# Altium footprint library con-molex.PCBLIB: 369 footprints (part 6 of 26)
Each footprint in its own frame and in the unit in brackets; x right, y up, seen from the top. Pads: shape width x height; smd on the part's side, far side on the other; paste and mask are expansions set on the pad; w line width, h text height; cw(c..) or ccw(c..) is an arc to the next point about the centre after c.
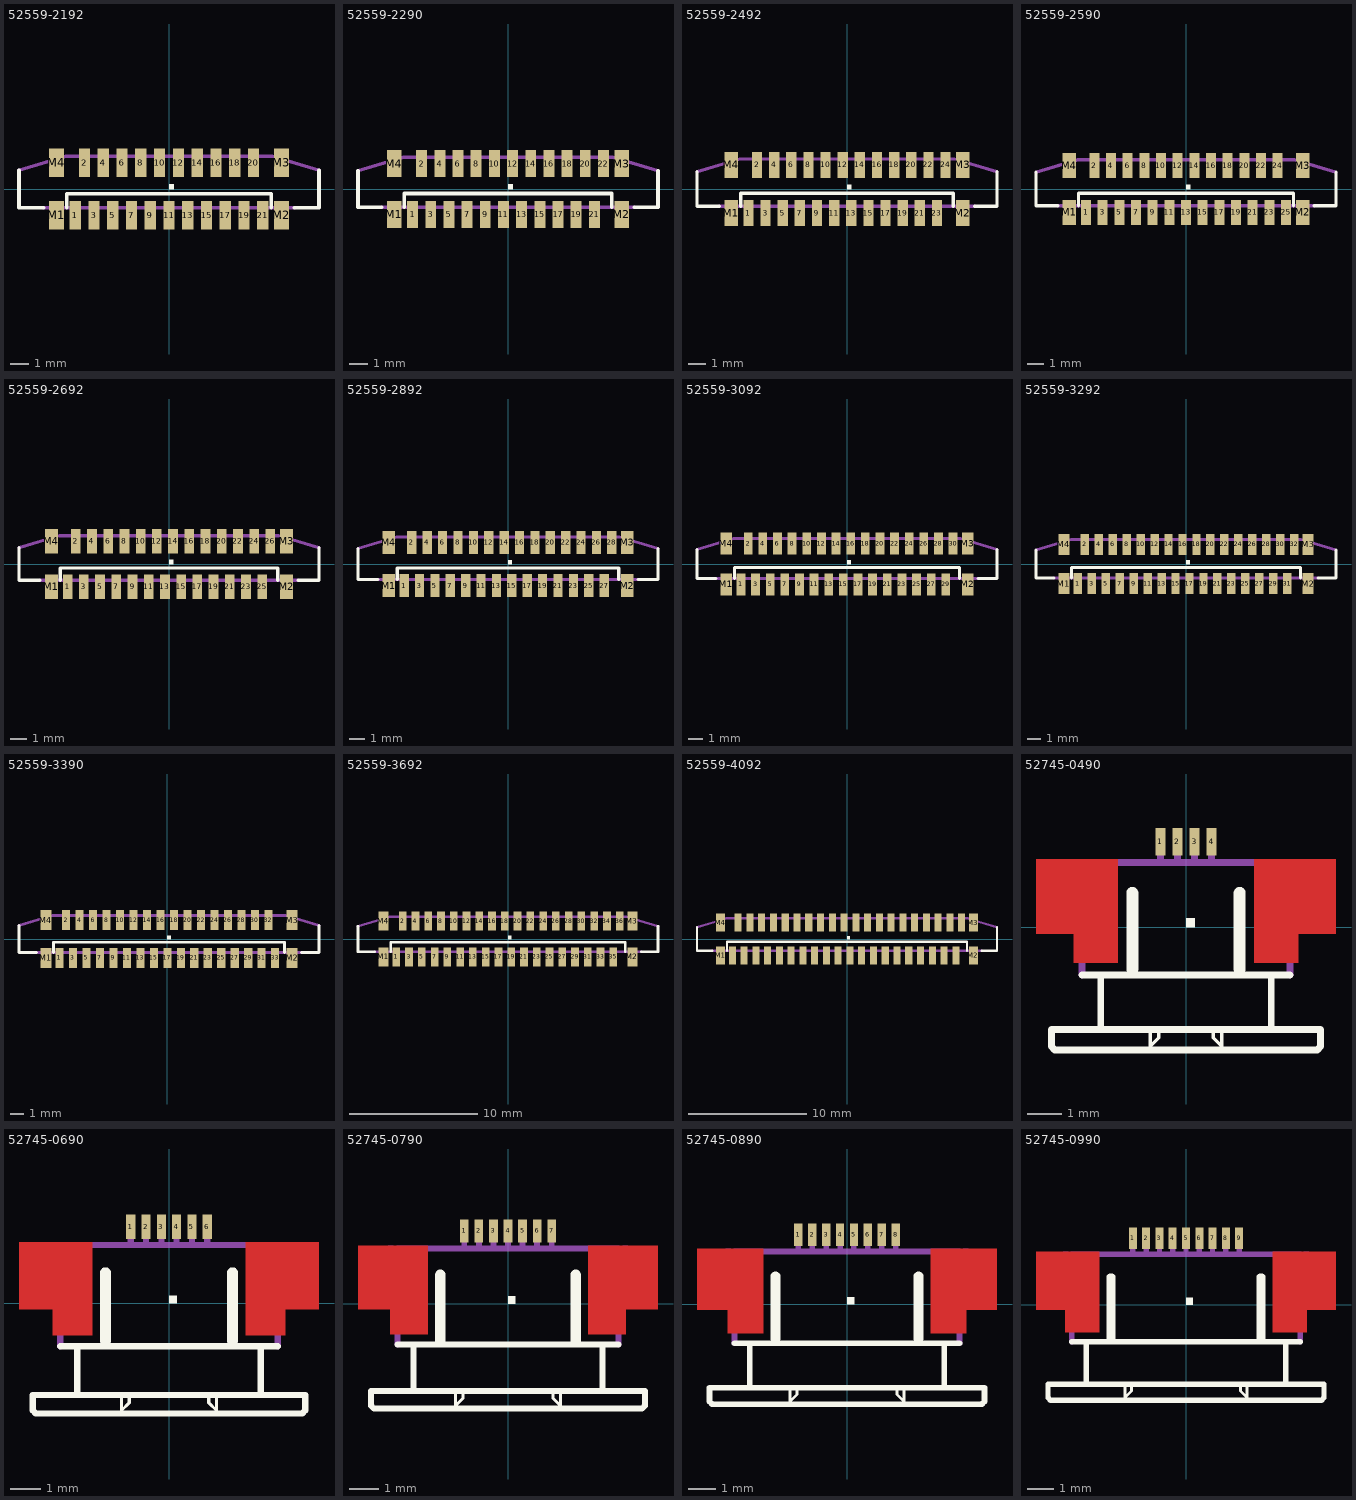
[diagram p5: the footprints below, top view; thin cyan lines are the x and y axes]

## 52559-2192 [mm]
pads (25):
  rect 0.6x1.5 smd: 1(-5,-1.4) 2(-4.5,1.4) 3(-4,-1.4) 4(-3.5,1.4) 5(-3,-1.4) 6(-2.5,1.4) 7(-2,-1.4) 8(-1.5,1.4) 9(-1,-1.4) 10(-0.5,1.4) 11(0,-1.4) 12(0.5,1.4) 13(1,-1.4) 14(1.5,1.4) 15(2,-1.4) 16(2.5,1.4) 17(3,-1.4) 18(3.5,1.4) 19(4,-1.4) 20(4.5,1.4) 21(5,-1.4)
  rect 0.8x1.5 smd: M1(-6,-1.4) M2(6,-1.4) M3(6,1.4) M4(-6,1.4)
Top Overlay:
  region: 0,0 0.254,0 0.254,0.254 0,0.254
  lines w0.203: -8,1 -8,-1 -6.7,-1 ; -5.45,-1 -5.45,-0.25 5.45,-0.25 5.45,-1 ; 6.7,-1 8,-1 8,1
Mechanical 16:
  rectangle: -6.25,-1.55 -5.75,-1.1
  rectangle: -5.15,-1.55 -4.85,-1.1
  rectangle: -4.15,-1.55 -3.85,-1.1
  rectangle: -3.15,-1.55 -2.85,-1.1
  rectangle: 5.75,-1.55 6.25,-1.1
  rectangle: -2.15,-1.55 -1.85,-1.1
  rectangle: -1.15,-1.55 -0.85,-1.1
  rectangle: -0.15,-1.55 0.15,-1.1
  rectangle: 0.85,-1.55 1.15,-1.1
  rectangle: 1.85,-1.55 2.15,-1.1
  rectangle: 2.85,-1.55 3.15,-1.1
  rectangle: 3.85,-1.55 4.15,-1.1
  rectangle: 4.85,-1.55 5.15,-1.1
  lines w0.203: -8,1 -5.5,1.75 5.5,1.75 8,1 ; -6.7,-1 6.7,-1

## 52559-2290 [mil]
pads (26):
  rect 23.62x59.06 smd: 1(-206.69,-55.12) 2(-187.01,55.12) 3(-167.32,-55.12) 4(-147.64,55.12) 5(-127.95,-55.12) 6(-108.27,55.12) 7(-88.58,-55.12) 8(-68.9,55.12) 9(-49.21,-55.12) 10(-29.53,55.12) 11(-9.84,-55.12) 12(9.84,55.12) 13(29.53,-55.12) 14(49.21,55.12) 15(68.9,-55.12) 16(88.58,55.12) 17(108.27,-55.12) 18(127.95,55.12) 19(147.64,-55.12) 20(167.32,55.12) 21(187.01,-55.12) 22(206.69,55.12)
  rect 31.5x59.06 smd: M1(-246.06,-55.12) M2(246.06,-55.12) M3(246.06,55.12) M4(-246.06,55.12)
Top Overlay:
  region: 0,0 10,0 10,10 0,10
  lines w8: -324.8,39.37 -324.8,-39.37 -273.62,-39.37 ; -224.41,-39.37 -224.41,-9.84 224.41,-9.84 224.41,-39.37 ; 273.62,-39.37 324.8,-39.37 324.8,39.37
Mechanical 16:
  rectangle: -255.91,-61.02 -236.22,-43.31
  rectangle: -212.6,-61.02 -200.79,-43.31
  rectangle: -173.23,-61.02 -161.42,-43.31
  rectangle: -133.86,-61.02 -122.05,-43.31
  rectangle: 236.22,-61.02 255.91,-43.31
  rectangle: -94.49,-61.02 -82.68,-43.31
  rectangle: -55.12,-61.02 -43.31,-43.31
  rectangle: -15.75,-61.02 -3.94,-43.31
  rectangle: 23.62,-61.02 35.43,-43.31
  rectangle: 62.99,-61.02 74.8,-43.31
  rectangle: 102.36,-61.02 114.17,-43.31
  rectangle: 141.73,-61.02 153.54,-43.31
  rectangle: 181.1,-61.02 192.91,-43.31
  lines w8: -324.8,39.37 -226.38,68.9 226.38,68.9 324.8,39.37 ; -273.62,-39.37 273.62,-39.37

## 52559-2492 [mil]
pads (28):
  rect 23.62x59.06 smd: 1(-226.38,-55.12) 2(-206.69,55.12) 3(-187.01,-55.12) 4(-167.32,55.12) 5(-147.64,-55.12) 6(-127.95,55.12) 7(-108.27,-55.12) 8(-88.58,55.12) 9(-68.9,-55.12) 10(-49.21,55.12) 11(-29.53,-55.12) 12(-9.84,55.12) 13(9.84,-55.12) 14(29.53,55.12) 15(49.21,-55.12) 16(68.9,55.12) 17(88.58,-55.12) 18(108.27,55.12) 19(127.95,-55.12) 20(147.64,55.12) 21(167.32,-55.12) 22(187.01,55.12) 23(206.69,-55.12) 24(226.38,55.12)
  rect 31.5x59.06 smd: M1(-265.75,-55.12) M2(265.75,-55.12) M3(265.75,55.12) M4(-265.75,55.12)
Top Overlay:
  region: 0,0 10,0 10,10 0,10
  lines w8: -344.49,39.37 -344.49,-39.37 -293.31,-39.37 ; -244.09,-39.37 -244.09,-9.84 244.09,-9.84 244.09,-39.37 ; 293.31,-39.37 344.49,-39.37 344.49,39.37
Mechanical 16:
  rectangle: -275.59,-61.02 -255.91,-43.31
  rectangle: -232.28,-61.02 -220.47,-43.31
  rectangle: -192.91,-61.02 -181.1,-43.31
  rectangle: -153.54,-61.02 -141.73,-43.31
  rectangle: 255.91,-61.02 275.59,-43.31
  rectangle: -114.17,-61.02 -102.36,-43.31
  rectangle: -74.8,-61.02 -62.99,-43.31
  rectangle: -35.43,-61.02 -23.62,-43.31
  rectangle: 3.94,-61.02 15.75,-43.31
  rectangle: 43.31,-61.02 55.12,-43.31
  rectangle: 82.68,-61.02 94.49,-43.31
  rectangle: 122.05,-61.02 133.86,-43.31
  rectangle: 161.42,-61.02 173.23,-43.31
  rectangle: 200.79,-61.02 212.6,-43.31
  lines w8: -344.49,39.37 -246.06,68.9 246.06,68.9 344.49,39.37 ; -293.31,-39.37 293.31,-39.37

## 52559-2590 [mm]
pads (29):
  rect 0.6x1.5 smd: 1(-6,-1.4) 2(-5.5,1.4) 3(-5,-1.4) 4(-4.5,1.4) 5(-4,-1.4) 6(-3.5,1.4) 7(-3,-1.4) 8(-2.5,1.4) 9(-2,-1.4) 10(-1.5,1.4) 11(-1,-1.4) 12(-0.5,1.4) 13(0,-1.4) 14(0.5,1.4) 15(1,-1.4) 16(1.5,1.4) 17(2,-1.4) 18(2.5,1.4) 19(3,-1.4) 20(3.5,1.4) 21(4,-1.4) 22(4.5,1.4) 23(5,-1.4) 24(5.5,1.4) 25(6,-1.4)
  rect 0.8x1.5 smd: M1(-7,-1.4) M2(7,-1.4) M3(7,1.4) M4(-7,1.4)
Top Overlay:
  region: 0,0 0.254,0 0.254,0.254 0,0.254
  lines w0.203: -9,1 -9,-1 -7.7,-1 ; -6.45,-1 -6.45,-0.25 6.45,-0.25 6.45,-1 ; 7.7,-1 9,-1 9,1
Mechanical 16:
  rectangle: -7.25,-1.55 -6.75,-1.1
  rectangle: -6.15,-1.55 -5.85,-1.1
  rectangle: -5.15,-1.55 -4.85,-1.1
  rectangle: -4.15,-1.55 -3.85,-1.1
  rectangle: 6.75,-1.55 7.25,-1.1
  rectangle: -3.15,-1.55 -2.85,-1.1
  rectangle: -2.15,-1.55 -1.85,-1.1
  rectangle: -1.15,-1.55 -0.85,-1.1
  rectangle: -0.15,-1.55 0.15,-1.1
  rectangle: 0.85,-1.55 1.15,-1.1
  rectangle: 1.85,-1.55 2.15,-1.1
  rectangle: 2.85,-1.55 3.15,-1.1
  rectangle: 3.85,-1.55 4.15,-1.1
  rectangle: 4.85,-1.55 5.15,-1.1
  rectangle: 5.85,-1.55 6.15,-1.1
  lines w0.203: -9,1 -6.5,1.75 6.5,1.75 9,1 ; -7.7,-1 7.7,-1

## 52559-2692 [mil]
pads (30):
  rect 23.62x59.06 smd: 1(-246.06,-55.12) 2(-226.38,55.12) 3(-206.69,-55.12) 4(-187.01,55.12) 5(-167.32,-55.12) 6(-147.64,55.12) 7(-127.95,-55.12) 8(-108.27,55.12) 9(-88.58,-55.12) 10(-68.9,55.12) 11(-49.21,-55.12) 12(-29.53,55.12) 13(-9.84,-55.12) 14(9.84,55.12) 15(29.53,-55.12) 16(49.21,55.12) 17(68.9,-55.12) 18(88.58,55.12) 19(108.27,-55.12) 20(127.95,55.12) 21(147.64,-55.12) 22(167.32,55.12) 23(187.01,-55.12) 24(206.69,55.12) 25(226.38,-55.12) 26(246.06,55.12)
  rect 31.5x59.06 smd: M1(-285.43,-55.12) M2(285.43,-55.12) M3(285.43,55.12) M4(-285.43,55.12)
Top Overlay:
  region: 0,0 10,0 10,10 0,10
  lines w8: -364.17,39.37 -364.17,-39.37 -312.99,-39.37 ; -263.78,-39.37 -263.78,-9.84 263.78,-9.84 263.78,-39.37 ; 312.99,-39.37 364.17,-39.37 364.17,39.37
Mechanical 16:
  rectangle: -295.28,-61.02 -275.59,-43.31
  rectangle: -251.97,-61.02 -240.16,-43.31
  rectangle: -212.6,-61.02 -200.79,-43.31
  rectangle: -173.23,-61.02 -161.42,-43.31
  rectangle: 275.59,-61.02 295.28,-43.31
  rectangle: -133.86,-61.02 -122.05,-43.31
  rectangle: -94.49,-61.02 -82.68,-43.31
  rectangle: -55.12,-61.02 -43.31,-43.31
  rectangle: -15.75,-61.02 -3.94,-43.31
  rectangle: 23.62,-61.02 35.43,-43.31
  rectangle: 62.99,-61.02 74.8,-43.31
  rectangle: 102.36,-61.02 114.17,-43.31
  rectangle: 141.73,-61.02 153.54,-43.31
  rectangle: 181.1,-61.02 192.91,-43.31
  rectangle: 220.47,-61.02 232.28,-43.31
  lines w8: -364.17,39.37 -265.75,68.9 265.75,68.9 364.17,39.37 ; -312.99,-39.37 312.99,-39.37

## 52559-2892 [mil]
pads (32):
  rect 23.62x59.06 smd: 1(-265.75,-55.12) 2(-246.06,55.12) 3(-226.38,-55.12) 4(-206.69,55.12) 5(-187.01,-55.12) 6(-167.32,55.12) 7(-147.64,-55.12) 8(-127.95,55.12) 9(-108.27,-55.12) 10(-88.58,55.12) 11(-68.9,-55.12) 12(-49.21,55.12) 13(-29.53,-55.12) 14(-9.84,55.12) 15(9.84,-55.12) 16(29.53,55.12) 17(49.21,-55.12) 18(68.9,55.12) 19(88.58,-55.12) 20(108.27,55.12) 21(127.95,-55.12) 22(147.64,55.12) 23(167.32,-55.12) 24(187.01,55.12) 25(206.69,-55.12) 26(226.38,55.12) 27(246.06,-55.12) 28(265.75,55.12)
  rect 31.5x59.06 smd: M1(-305.12,-55.12) M2(305.12,-55.12) M3(305.12,55.12) M4(-305.12,55.12)
Top Overlay:
  region: 0,0 10,0 10,10 0,10
  lines w8: -383.86,39.37 -383.86,-39.37 -332.68,-39.37 ; -283.46,-39.37 -283.46,-9.84 283.46,-9.84 283.46,-39.37 ; 332.68,-39.37 383.86,-39.37 383.86,39.37
Mechanical 16:
  rectangle: -314.96,-61.02 -295.28,-43.31
  rectangle: -271.65,-61.02 -259.84,-43.31
  rectangle: -232.28,-61.02 -220.47,-43.31
  rectangle: -192.91,-61.02 -181.1,-43.31
  rectangle: 295.28,-61.02 314.96,-43.31
  rectangle: -153.54,-61.02 -141.73,-43.31
  rectangle: -114.17,-61.02 -102.36,-43.31
  rectangle: -74.8,-61.02 -62.99,-43.31
  rectangle: -35.43,-61.02 -23.62,-43.31
  rectangle: 3.94,-61.02 15.75,-43.31
  rectangle: 43.31,-61.02 55.12,-43.31
  rectangle: 82.68,-61.02 94.49,-43.31
  rectangle: 122.05,-61.02 133.86,-43.31
  rectangle: 161.42,-61.02 173.23,-43.31
  rectangle: 200.79,-61.02 212.6,-43.31
  rectangle: 240.16,-61.02 251.97,-43.31
  lines w8: -383.86,39.37 -285.43,68.9 285.43,68.9 383.86,39.37 ; -332.68,-39.37 332.68,-39.37

## 52559-3092 [mil]
pads (34):
  rect 23.62x59.06 smd: 1(-285.43,-55.12) 2(-265.75,55.12) 3(-246.06,-55.12) 4(-226.38,55.12) 5(-206.69,-55.12) 6(-187.01,55.12) 7(-167.32,-55.12) 8(-147.64,55.12) 9(-127.95,-55.12) 10(-108.27,55.12) 11(-88.58,-55.12) 12(-68.9,55.12) 13(-49.21,-55.12) 14(-29.53,55.12) 15(-9.84,-55.12) 16(9.84,55.12) 17(29.53,-55.12) 18(49.21,55.12) 19(68.9,-55.12) 20(88.58,55.12) 21(108.27,-55.12) 22(127.95,55.12) 23(147.64,-55.12) 24(167.32,55.12) 25(187.01,-55.12) 26(206.69,55.12) 27(226.38,-55.12) 28(246.06,55.12) 29(265.75,-55.12) 30(285.43,55.12)
  rect 31.5x59.06 smd: M1(-324.8,-55.12) M2(324.8,-55.12) M3(324.8,55.12) M4(-324.8,55.12)
Top Overlay:
  region: 0,0 10,0 10,10 0,10
  lines w8: -403.54,39.37 -403.54,-39.37 -352.36,-39.37 ; -303.15,-39.37 -303.15,-9.84 303.15,-9.84 303.15,-39.37 ; 352.36,-39.37 403.54,-39.37 403.54,39.37
Mechanical 16:
  rectangle: -334.65,-61.02 -314.96,-43.31
  rectangle: -291.34,-61.02 -279.53,-43.31
  rectangle: -251.97,-61.02 -240.16,-43.31
  rectangle: -212.6,-61.02 -200.79,-43.31
  rectangle: 314.96,-61.02 334.65,-43.31
  rectangle: -173.23,-61.02 -161.42,-43.31
  rectangle: -133.86,-61.02 -122.05,-43.31
  rectangle: -94.49,-61.02 -82.68,-43.31
  rectangle: -55.12,-61.02 -43.31,-43.31
  rectangle: -15.75,-61.02 -3.94,-43.31
  rectangle: 23.62,-61.02 35.43,-43.31
  rectangle: 62.99,-61.02 74.8,-43.31
  rectangle: 102.36,-61.02 114.17,-43.31
  rectangle: 141.73,-61.02 153.54,-43.31
  rectangle: 181.1,-61.02 192.91,-43.31
  rectangle: 220.47,-61.02 232.28,-43.31
  rectangle: 259.84,-61.02 271.65,-43.31
  lines w8: -403.54,39.37 -305.12,68.9 305.12,68.9 403.54,39.37 ; -352.36,-39.37 352.36,-39.37

## 52559-3292 [mil]
pads (36):
  rect 23.62x59.06 smd: 1(-305.12,-55.12) 2(-285.43,55.12) 3(-265.75,-55.12) 4(-246.06,55.12) 5(-226.38,-55.12) 6(-206.69,55.12) 7(-187.01,-55.12) 8(-167.32,55.12) 9(-147.64,-55.12) 10(-127.95,55.12) 11(-108.27,-55.12) 12(-88.58,55.12) 13(-68.9,-55.12) 14(-49.21,55.12) 15(-29.53,-55.12) 16(-9.84,55.12) 17(9.84,-55.12) 18(29.53,55.12) 19(49.21,-55.12) 20(68.9,55.12) 21(88.58,-55.12) 22(108.27,55.12) 23(127.95,-55.12) 24(147.64,55.12) 25(167.32,-55.12) 26(187.01,55.12) 27(206.69,-55.12) 28(226.38,55.12) 29(246.06,-55.12) 30(265.75,55.12) 31(285.43,-55.12) 32(305.12,55.12)
  rect 31.5x59.06 smd: M1(-344.49,-55.12) M2(344.49,-55.12) M3(344.49,55.12) M4(-344.49,55.12)
Top Overlay:
  region: 0,0 10,0 10,10 0,10
  lines w8: -423.23,39.37 -423.23,-39.37 -372.05,-39.37 ; -322.83,-39.37 -322.83,-9.84 322.83,-9.84 322.83,-39.37 ; 372.05,-39.37 423.23,-39.37 423.23,39.37
Mechanical 16:
  rectangle: -354.33,-61.02 -334.65,-43.31
  rectangle: -311.02,-61.02 -299.21,-43.31
  rectangle: -271.65,-61.02 -259.84,-43.31
  rectangle: -232.28,-61.02 -220.47,-43.31
  rectangle: 334.65,-61.02 354.33,-43.31
  rectangle: -192.91,-61.02 -181.1,-43.31
  rectangle: -153.54,-61.02 -141.73,-43.31
  rectangle: -114.17,-61.02 -102.36,-43.31
  rectangle: -74.8,-61.02 -62.99,-43.31
  rectangle: -35.43,-61.02 -23.62,-43.31
  rectangle: 3.94,-61.02 15.75,-43.31
  rectangle: 43.31,-61.02 55.12,-43.31
  rectangle: 82.68,-61.02 94.49,-43.31
  rectangle: 122.05,-61.02 133.86,-43.31
  rectangle: 161.42,-61.02 173.23,-43.31
  rectangle: 200.79,-61.02 212.6,-43.31
  rectangle: 240.16,-61.02 251.97,-43.31
  rectangle: 279.53,-61.02 291.34,-43.31
  lines w8: -423.23,39.37 -324.8,68.9 324.8,68.9 423.23,39.37 ; -372.05,-39.37 372.05,-39.37

## 52559-3390 [mm]
pads (37):
  rect 0.6x1.5 smd: 1(-8,-1.4) 2(-7.5,1.4) 3(-7,-1.4) 4(-6.5,1.4) 5(-6,-1.4) 6(-5.5,1.4) 7(-5,-1.4) 8(-4.5,1.4) 9(-4,-1.4) 10(-3.5,1.4) 11(-3,-1.4) 12(-2.5,1.4) 13(-2,-1.4) 14(-1.5,1.4) 15(-1,-1.4) 16(-0.5,1.4) 17(0,-1.4) 18(0.5,1.4) 19(1,-1.4) 20(1.5,1.4) 21(2,-1.4) 22(2.5,1.4) 23(3,-1.4) 24(3.5,1.4) 25(4,-1.4) 26(4.5,1.4) 27(5,-1.4) 28(5.5,1.4) 29(6,-1.4) 30(6.5,1.4) 31(7,-1.4) 32(7.5,1.4) 33(8,-1.4)
  rect 0.8x1.5 smd: M1(-9,-1.4) M2(9.25,-1.4) M3(9.25,1.4) M4(-9,1.4)
Top Overlay:
  region: 0,0 0.254,0 0.254,0.254 0,0.254
  lines w0.203: -11,1 -11,-1 -9.7,-1 ; -8.45,-1 -8.45,-0.25 8.7,-0.25 8.7,-1 ; 9.95,-1 11.25,-1 11.25,1
Mechanical 16:
  rectangle: -9.25,-1.55 -8.75,-1.1
  rectangle: -8.15,-1.55 -7.85,-1.1
  rectangle: -7.15,-1.55 -6.85,-1.1
  rectangle: -6.15,-1.55 -5.85,-1.1
  rectangle: 9,-1.55 9.5,-1.1
  rectangle: -5.15,-1.55 -4.85,-1.1
  rectangle: -4.15,-1.55 -3.85,-1.1
  rectangle: -3.15,-1.55 -2.85,-1.1
  rectangle: -2.15,-1.55 -1.85,-1.1
  rectangle: -1.15,-1.55 -0.85,-1.1
  rectangle: -0.15,-1.55 0.15,-1.1
  rectangle: 0.85,-1.55 1.15,-1.1
  rectangle: 1.85,-1.55 2.15,-1.1
  rectangle: 2.85,-1.55 3.15,-1.1
  rectangle: 3.85,-1.55 4.15,-1.1
  rectangle: 4.85,-1.55 5.15,-1.1
  rectangle: 5.85,-1.55 6.15,-1.1
  rectangle: 6.85,-1.55 7.15,-1.1
  rectangle: 7.85,-1.55 8.15,-1.1
  lines w0.203: -11,1 -8.5,1.75 8.75,1.75 11.25,1 ; -9.7,-1 9.95,-1

## 52559-3692 [mil]
pads (40):
  rect 23.62x59.06 smd: 1(-344.49,-55.12) 2(-324.8,55.12) 3(-305.12,-55.12) 4(-285.43,55.12) 5(-265.75,-55.12) 6(-246.06,55.12) 7(-226.38,-55.12) 8(-206.69,55.12) 9(-187.01,-55.12) 10(-167.32,55.12) 11(-147.64,-55.12) 12(-127.95,55.12) 13(-108.27,-55.12) 14(-88.58,55.12) 15(-68.9,-55.12) 16(-49.21,55.12) 17(-29.53,-55.12) 18(-9.84,55.12) 19(9.84,-55.12) 20(29.53,55.12) 21(49.21,-55.12) 22(68.9,55.12) 23(88.58,-55.12) 24(108.27,55.12) 25(127.95,-55.12) 26(147.64,55.12) 27(167.32,-55.12) 28(187.01,55.12) 29(206.69,-55.12) 30(226.38,55.12) 31(246.06,-55.12) 32(265.75,55.12) 33(285.43,-55.12) 34(305.12,55.12) 35(324.8,-55.12) 36(344.49,55.12)
  rect 31.5x59.06 smd: M1(-383.86,-55.12) M2(383.86,-55.12) M3(383.86,55.12) M4(-383.86,55.12)
Top Overlay:
  region: 0,0 10,0 10,10 0,10
  lines w8: -462.6,39.37 -462.6,-39.37 -411.42,-39.37 ; -362.2,-39.37 -362.2,-9.84 362.2,-9.84 362.2,-39.37 ; 411.42,-39.37 462.6,-39.37 462.6,39.37
Mechanical 16:
  rectangle: -393.7,-61.02 -374.02,-43.31
  rectangle: -350.39,-61.02 -338.58,-43.31
  rectangle: -311.02,-61.02 -299.21,-43.31
  rectangle: -271.65,-61.02 -259.84,-43.31
  rectangle: 374.02,-61.02 393.7,-43.31
  rectangle: -232.28,-61.02 -220.47,-43.31
  rectangle: -192.91,-61.02 -181.1,-43.31
  rectangle: -153.54,-61.02 -141.73,-43.31
  rectangle: -114.17,-61.02 -102.36,-43.31
  rectangle: -74.8,-61.02 -62.99,-43.31
  rectangle: -35.43,-61.02 -23.62,-43.31
  rectangle: 3.94,-61.02 15.75,-43.31
  rectangle: 43.31,-61.02 55.12,-43.31
  rectangle: 82.68,-61.02 94.49,-43.31
  rectangle: 122.05,-61.02 133.86,-43.31
  rectangle: 161.42,-61.02 173.23,-43.31
  rectangle: 200.79,-61.02 212.6,-43.31
  rectangle: 240.16,-61.02 251.97,-43.31
  rectangle: 279.53,-61.02 291.34,-43.31
  rectangle: 318.9,-61.02 330.71,-43.31
  lines w8: -462.6,39.37 -364.17,68.9 364.17,68.9 462.6,39.37 ; -411.42,-39.37 411.42,-39.37

## 52559-4092 [mil]
pads (44):
  rect 23.62x59.06 smd: 1(-383.86,-55.12) 2(-364.17,55.12) 3(-344.49,-55.12) 4(-324.8,55.12) 5(-305.12,-55.12) 6(-285.43,55.12) 7(-265.75,-55.12) 8(-246.06,55.12) 9(-226.38,-55.12) 10(-206.69,55.12) 11(-187.01,-55.12) 12(-167.32,55.12) 13(-147.64,-55.12) 14(-127.95,55.12) 15(-108.27,-55.12) 16(-88.58,55.12) 17(-68.9,-55.12) 18(-49.21,55.12) 19(-29.53,-55.12) 20(-9.84,55.12) 21(9.84,-55.12) 22(29.53,55.12) 23(49.21,-55.12) 24(68.9,55.12) 25(88.58,-55.12) 26(108.27,55.12) 27(127.95,-55.12) 28(147.64,55.12) 29(167.32,-55.12) 30(187.01,55.12) 31(206.69,-55.12) 32(226.38,55.12) 33(246.06,-55.12) 34(265.75,55.12) 35(285.43,-55.12) 36(305.12,55.12) 37(324.8,-55.12) 38(344.49,55.12) 39(364.17,-55.12) 40(383.86,55.12)
  rect 31.5x59.06 smd: M1(-423.23,-55.12) M2(423.23,-55.12) M3(423.23,55.12) M4(-423.23,55.12)
Top Overlay:
  region: 0,0 10,0 10,10 0,10
  lines w8: -501.97,39.37 -501.97,-39.37 -450.79,-39.37 ; -401.57,-39.37 -401.57,-9.84 401.57,-9.84 401.57,-39.37 ; 450.79,-39.37 501.97,-39.37 501.97,39.37
Mechanical 16:
  rectangle: -433.07,-61.02 -413.39,-43.31
  rectangle: -389.76,-61.02 -377.95,-43.31
  rectangle: -350.39,-61.02 -338.58,-43.31
  rectangle: -311.02,-61.02 -299.21,-43.31
  rectangle: 413.39,-61.02 433.07,-43.31
  rectangle: -271.65,-61.02 -259.84,-43.31
  rectangle: -232.28,-61.02 -220.47,-43.31
  rectangle: -192.91,-61.02 -181.1,-43.31
  rectangle: -153.54,-61.02 -141.73,-43.31
  rectangle: -114.17,-61.02 -102.36,-43.31
  rectangle: -74.8,-61.02 -62.99,-43.31
  rectangle: -35.43,-61.02 -23.62,-43.31
  rectangle: 3.94,-61.02 15.75,-43.31
  rectangle: 43.31,-61.02 55.12,-43.31
  rectangle: 82.68,-61.02 94.49,-43.31
  rectangle: 122.05,-61.02 133.86,-43.31
  rectangle: 161.42,-61.02 173.23,-43.31
  rectangle: 200.79,-61.02 212.6,-43.31
  rectangle: 240.16,-61.02 251.97,-43.31
  rectangle: 279.53,-61.02 291.34,-43.31
  rectangle: 318.9,-61.02 330.71,-43.31
  rectangle: 358.27,-61.02 370.08,-43.31
  lines w8: -501.97,39.37 -403.54,68.9 403.54,68.9 501.97,39.37 ; -450.79,-39.37 450.79,-39.37

## 52745-0490 [mil]
pads (4):
  rect 11.81x31.5 smd: 1(-29.53,98.43) 2(-9.84,98.43) 3(9.84,98.43) 4(29.53,98.43)
Top Layer:
  rectangle: -173.23,-7.87 -78.74,78.74
  rectangle: -129.92,-41.34 -78.74,-7.87
  rectangle: 78.74,-41.34 129.92,-7.87
  rectangle: 78.74,-7.87 173.23,78.74
Top Overlay:
  region: 0,0 10,0 10,10 0,10
  lines w4: -41.34,-122.05 -41.34,-137.8 -31.5,-127.95 -31.5,-122.05 ; 31.5,-122.05 31.5,-127.95 41.34,-137.8 41.34,-122.05
  lines w8: -120.08,-55.12 120.08,-55.12 ; -98.43,-114.17 -98.43,-59.06 ; -64.96,-49.21 -64.96,39.37 cw(c-62.01,39.37) -59.06,39.37 -59.06,-49.21 ; 59.06,-49.21 59.06,39.37 cw(c62.01,39.37) 64.96,39.37 64.96,-49.21 ; 98.43,-114.17 98.43,-59.06 ; -155.51,-137.8 -155.51,-118.11 155.51,-118.11 155.51,-137.8 151.57,-141.73 -151.57,-141.73 -155.51,-137.8
Top Paste:
  region: 165.35,72.83 86.61,72.83 86.61,-1.97 165.35,-1.97
  rectangle: -165.35,-1.97 -86.61,72.83
Top Solder:
  region: 173.23,78.74 127.95,78.74 127.95,-7.87 173.23,-7.87
  region: 129.92,78.74 78.74,78.74 78.74,-41.34 129.92,-41.34
  rectangle: -173.23,-7.87 -127.95,78.74
  rectangle: -129.92,-41.34 -78.74,78.74
Mechanical 16:
  rectangle: -33.46,78.74 -25.59,106.3
  rectangle: -13.78,78.74 -5.91,106.3
  rectangle: 5.91,78.74 13.78,106.3
  rectangle: 25.59,78.74 33.46,106.3
  lines w4: -125.98,74.8 -125.98,27.56 -155.51,27.56 -155.51,35.43 -133.86,35.43 -131.89,37.4 -131.89,57.09 -155.51,57.09 -155.51,64.96 -131.89,64.96 -131.89,76.77 -125.98,76.77 ; 125.98,74.8 125.98,27.56 155.51,27.56 155.51,35.43 133.86,35.43 131.89,37.4 131.89,57.09 155.51,57.09 155.51,64.96 131.89,64.96 131.89,76.77 125.98,76.77
  lines w8: -120.08,-55.12 -120.08,74.8 120.08,74.8 120.08,-55.12

## 52745-0690 [mil]
pads (6):
  rect 11.81x31.5 smd: 1(-49.21,98.43) 2(-29.53,98.43) 3(-9.84,98.43) 4(9.84,98.43) 5(29.53,98.43) 6(49.21,98.43)
Top Layer:
  rectangle: -192.91,-7.87 -98.43,78.74
  rectangle: -149.61,-41.34 -98.43,-7.87
  rectangle: 98.43,-41.34 149.61,-7.87
  rectangle: 98.43,-7.87 192.91,78.74
Top Overlay:
  region: 0,0 10,0 10,10 0,10
  lines w4: -61.02,-122.05 -61.02,-137.8 -51.18,-127.95 -51.18,-122.05 ; 51.18,-122.05 51.18,-127.95 61.02,-137.8 61.02,-122.05
  lines w8: -139.76,-55.12 139.76,-55.12 ; -118.11,-114.17 -118.11,-59.06 ; -84.65,-49.21 -84.65,39.37 cw(c-81.69,39.37) -78.74,39.37 -78.74,-49.21 ; 78.74,-49.21 78.74,39.37 cw(c81.69,39.37) 84.65,39.37 84.65,-49.21 ; 118.11,-114.17 118.11,-59.06 ; -175.2,-137.8 -175.2,-118.11 175.2,-118.11 175.2,-137.8 171.26,-141.73 -171.26,-141.73 -175.2,-137.8
Top Paste:
  region: 185.04,72.83 106.3,72.83 106.3,-1.97 185.04,-1.97
  rectangle: -185.04,-1.97 -106.3,72.83
Top Solder:
  region: 192.91,78.74 147.64,78.74 147.64,-7.87 192.91,-7.87
  region: 149.61,78.74 98.43,78.74 98.43,-41.34 149.61,-41.34
  rectangle: -192.91,-7.87 -147.64,78.74
  rectangle: -149.61,-41.34 -98.43,78.74
Mechanical 16:
  rectangle: -53.15,78.74 -45.28,106.3
  rectangle: -33.46,78.74 -25.59,106.3
  rectangle: -13.78,78.74 -5.91,106.3
  rectangle: 5.91,78.74 13.78,106.3
  rectangle: 25.59,78.74 33.46,106.3
  rectangle: 45.28,78.74 53.15,106.3
  lines w4: -145.67,74.8 -145.67,27.56 -175.2,27.56 -175.2,35.43 -153.54,35.43 -151.57,37.4 -151.57,57.09 -175.2,57.09 -175.2,64.96 -151.57,64.96 -151.57,76.77 -145.67,76.77 ; 145.67,74.8 145.67,27.56 175.2,27.56 175.2,35.43 153.54,35.43 151.57,37.4 151.57,57.09 175.2,57.09 175.2,64.96 151.57,64.96 151.57,76.77 145.67,76.77
  lines w8: -139.76,-55.12 -139.76,74.8 139.76,74.8 139.76,-55.12

## 52745-0790 [mil]
pads (7):
  rect 11.81x31.5 smd: 1(-59.06,98.43) 2(-39.37,98.43) 3(-19.69,98.43) 4(0,98.43) 5(19.69,98.43) 6(39.37,98.43) 7(59.06,98.43)
Top Layer:
  rectangle: -202.76,-7.87 -108.27,78.74
  rectangle: -159.45,-41.34 -108.27,-7.87
  rectangle: 108.27,-41.34 159.45,-7.87
  rectangle: 108.27,-7.87 202.76,78.74
Top Overlay:
  region: 0,0 10,0 10,10 0,10
  lines w4: -70.87,-122.05 -70.87,-137.8 -61.02,-127.95 -61.02,-122.05 ; 61.02,-122.05 61.02,-127.95 70.87,-137.8 70.87,-122.05
  lines w8: -149.61,-55.12 149.61,-55.12 ; -127.95,-114.17 -127.95,-59.06 ; -94.49,-49.21 -94.49,39.37 cw(c-91.53,39.37) -88.58,39.37 -88.58,-49.21 ; 88.58,-49.21 88.58,39.37 cw(c91.53,39.37) 94.49,39.37 94.49,-49.21 ; 127.95,-114.17 127.95,-59.06 ; -185.04,-137.8 -185.04,-118.11 185.04,-118.11 185.04,-137.8 181.1,-141.73 -181.1,-141.73 -185.04,-137.8
Top Paste:
  region: 194.88,72.83 116.14,72.83 116.14,-1.97 194.88,-1.97
  rectangle: -194.88,-1.97 -116.14,72.83
Top Solder:
  region: 202.76,78.74 157.48,78.74 157.48,-7.87 202.76,-7.87
  region: 159.45,78.74 108.27,78.74 108.27,-41.34 159.45,-41.34
  rectangle: -202.76,-7.87 -157.48,78.74
  rectangle: -159.45,-41.34 -108.27,78.74
Mechanical 16:
  rectangle: -62.99,78.74 -55.12,106.3
  rectangle: -43.31,78.74 -35.43,106.3
  rectangle: -23.62,78.74 -15.75,106.3
  rectangle: -3.94,78.74 3.94,106.3
  rectangle: 15.75,78.74 23.62,106.3
  rectangle: 35.43,78.74 43.31,106.3
  rectangle: 55.12,78.74 62.99,106.3
  lines w4: -155.51,74.8 -155.51,27.56 -185.04,27.56 -185.04,35.43 -163.39,35.43 -161.42,37.4 -161.42,57.09 -185.04,57.09 -185.04,64.96 -161.42,64.96 -161.42,76.77 -155.51,76.77 ; 155.51,74.8 155.51,27.56 185.04,27.56 185.04,35.43 163.39,35.43 161.42,37.4 161.42,57.09 185.04,57.09 185.04,64.96 161.42,64.96 161.42,76.77 155.51,76.77
  lines w8: -149.61,-55.12 -149.61,74.8 149.61,74.8 149.61,-55.12

## 52745-0890 [mil]
pads (8):
  rect 11.81x31.5 smd: 1(-68.9,98.43) 2(-49.21,98.43) 3(-29.53,98.43) 4(-9.84,98.43) 5(9.84,98.43) 6(29.53,98.43) 7(49.21,98.43) 8(68.9,98.43)
Top Layer:
  rectangle: -212.6,-7.87 -118.11,78.74
  rectangle: -169.29,-41.34 -118.11,-7.87
  rectangle: 118.11,-41.34 169.29,-7.87
  rectangle: 118.11,-7.87 212.6,78.74
Top Overlay:
  region: 0,0 10,0 10,10 0,10
  lines w4: -80.71,-122.05 -80.71,-137.8 -70.87,-127.95 -70.87,-122.05 ; 70.87,-122.05 70.87,-127.95 80.71,-137.8 80.71,-122.05
  lines w8: -159.45,-55.12 159.45,-55.12 ; -137.8,-114.17 -137.8,-59.06 ; -104.33,-49.21 -104.33,39.37 cw(c-101.38,39.37) -98.43,39.37 -98.43,-49.21 ; 98.43,-49.21 98.43,39.37 cw(c101.38,39.37) 104.33,39.37 104.33,-49.21 ; 137.8,-114.17 137.8,-59.06 ; -194.88,-137.8 -194.88,-118.11 194.88,-118.11 194.88,-137.8 190.94,-141.73 -190.94,-141.73 -194.88,-137.8
Top Paste:
  region: 204.72,72.83 125.98,72.83 125.98,-1.97 204.72,-1.97
  rectangle: -204.72,-1.97 -125.98,72.83
Top Solder:
  region: 212.6,78.74 167.32,78.74 167.32,-7.87 212.6,-7.87
  region: 169.29,78.74 118.11,78.74 118.11,-41.34 169.29,-41.34
  rectangle: -212.6,-7.87 -167.32,78.74
  rectangle: -169.29,-41.34 -118.11,78.74
Mechanical 16:
  rectangle: -72.83,78.74 -64.96,106.3
  rectangle: -53.15,78.74 -45.28,106.3
  rectangle: -33.46,78.74 -25.59,106.3
  rectangle: -13.78,78.74 -5.91,106.3
  rectangle: 5.91,78.74 13.78,106.3
  rectangle: 25.59,78.74 33.46,106.3
  rectangle: 45.28,78.74 53.15,106.3
  rectangle: 64.96,78.74 72.83,106.3
  lines w4: -165.35,74.8 -165.35,27.56 -194.88,27.56 -194.88,35.43 -173.23,35.43 -171.26,37.4 -171.26,57.09 -194.88,57.09 -194.88,64.96 -171.26,64.96 -171.26,76.77 -165.35,76.77 ; 165.35,74.8 165.35,27.56 194.88,27.56 194.88,35.43 173.23,35.43 171.26,37.4 171.26,57.09 194.88,57.09 194.88,64.96 171.26,64.96 171.26,76.77 165.35,76.77
  lines w8: -159.45,-55.12 -159.45,74.8 159.45,74.8 159.45,-55.12

## 52745-0990 [mil]
pads (9):
  rect 11.81x31.5 smd: 1(-78.74,98.43) 2(-59.06,98.43) 3(-39.37,98.43) 4(-19.69,98.43) 5(0,98.43) 6(19.69,98.43) 7(39.37,98.43) 8(59.06,98.43) 9(78.74,98.43)
Top Layer:
  rectangle: -222.44,-7.87 -127.95,78.74
  rectangle: -179.13,-41.34 -127.95,-7.87
  rectangle: 127.95,-41.34 179.13,-7.87
  rectangle: 127.95,-7.87 222.44,78.74
Top Overlay:
  region: 0,0 10,0 10,10 0,10
  lines w4: -90.55,-122.05 -90.55,-137.8 -80.71,-127.95 -80.71,-122.05 ; 80.71,-122.05 80.71,-127.95 90.55,-137.8 90.55,-122.05
  lines w8: -169.29,-55.12 169.29,-55.12 ; -147.64,-114.17 -147.64,-59.06 ; -114.17,-49.21 -114.17,39.37 cw(c-111.22,39.37) -108.27,39.37 -108.27,-49.21 ; 108.27,-49.21 108.27,39.37 cw(c111.22,39.37) 114.17,39.37 114.17,-49.21 ; 147.64,-114.17 147.64,-59.06 ; -204.72,-137.8 -204.72,-118.11 204.72,-118.11 204.72,-137.8 200.79,-141.73 -200.79,-141.73 -204.72,-137.8
Top Paste:
  region: 214.57,72.83 135.83,72.83 135.83,-1.97 214.57,-1.97
  rectangle: -214.57,-1.97 -135.83,72.83
Top Solder:
  region: 222.44,78.74 177.17,78.74 177.17,-7.87 222.44,-7.87
  region: 179.13,78.74 127.95,78.74 127.95,-41.34 179.13,-41.34
  rectangle: -222.44,-7.87 -177.17,78.74
  rectangle: -179.13,-41.34 -127.95,78.74
Mechanical 16:
  rectangle: -82.68,78.74 -74.8,106.3
  rectangle: -62.99,78.74 -55.12,106.3
  rectangle: -43.31,78.74 -35.43,106.3
  rectangle: -23.62,78.74 -15.75,106.3
  rectangle: -3.94,78.74 3.94,106.3
  rectangle: 15.75,78.74 23.62,106.3
  rectangle: 35.43,78.74 43.31,106.3
  rectangle: 55.12,78.74 62.99,106.3
  rectangle: 74.8,78.74 82.68,106.3
  lines w4: -175.2,74.8 -175.2,27.56 -204.72,27.56 -204.72,35.43 -183.07,35.43 -181.1,37.4 -181.1,57.09 -204.72,57.09 -204.72,64.96 -181.1,64.96 -181.1,76.77 -175.2,76.77 ; 175.2,74.8 175.2,27.56 204.72,27.56 204.72,35.43 183.07,35.43 181.1,37.4 181.1,57.09 204.72,57.09 204.72,64.96 181.1,64.96 181.1,76.77 175.2,76.77
  lines w8: -169.29,-55.12 -169.29,74.8 169.29,74.8 169.29,-55.12